# Altium schematic symbol library jlcpcb_2025_04_resistors_extended_2512.schlib: 2667 symbols (part 7 of 14) (continued)
## FRC2512F1500TS (continued)
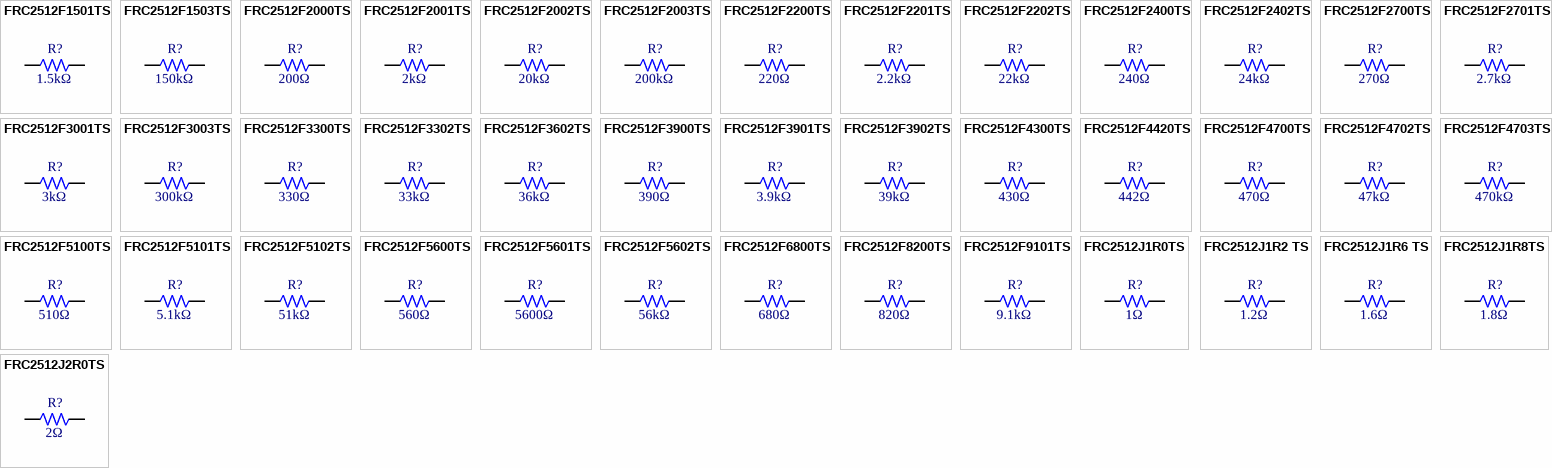
[diagram p32: symbols FRC2512F1501TS to FRC2512J2R0TS]

## FRC2512F1501TS
designator R?  Resistance: 1.5kΩ  (hidden comment: *)
Resistor, 1.5kΩ, ±1%, SMD 2512; Manufacturer: Uniroyal; Manufacturer Part Number: FRC2512F1501TS; Supplier 1: LCSC; Supplier Part Number 1: C5153994; JLCPCB Part Number: C5153994; Category: Resistors; Package Size: 2512; JLCPCB Basic Part: Yes; Tolerance: ±1%; ComponentLink1Description: Datasheet; ComponentLink1URL: https://wmsc.lcsc.com/wmsc/upload/file/pdf/v2/lcsc/2308241947_FOJAN-FRC2512F1501TS_C5153994.pdf; ComponentLink2Description: JLCPCB Part URL; ComponentLink2URL: https://jlcpcb.com/partdetail/C5153994
pins: 1, 2
1 alternate drawing of the same symbol

## FRC2512F1503TS
designator R?  Resistance: 150kΩ  (hidden comment: *)
Resistor, 150kΩ, ±1%, 1W, 200V, ±100ppm/℃, -55℃~+155℃, SMD 2512; Manufacturer: Uniroyal; Manufacturer Part Number: FRC2512F1503TS; Supplier 1: LCSC; Supplier Part Number 1: C2934050; JLCPCB Part Number: C2934050; Power Rating: 1W; Category: Resistors; Package Size: 2512; JLCPCB Basic Part: Yes; Tolerance: ±1%; Voltage Rating: 200V; Temperature Coefficient: ±100ppm/℃; Temperature Rating: -55℃~+155℃; ComponentLink1Description: Datasheet; ComponentLink1URL: https://wmsc.lcsc.com/wmsc/upload/file/pdf/v2/lcsc/2308241947_FOJAN-FRC2512F1503TS_C2934050.pdf; ComponentLink2Description: JLCPCB Part URL; ComponentLink2URL: https://jlcpcb.com/partdetail/C2934050
pins: 1, 2
1 alternate drawing of the same symbol

## FRC2512F2000TS
designator R?  Resistance: 200Ω  (hidden comment: *)
Resistor, 200Ω, ±1%, 1W, 200V, ±100ppm/℃, -55℃~+155℃, SMD 2512; Manufacturer: Uniroyal; Manufacturer Part Number: FRC2512F2000TS; Supplier 1: LCSC; Supplier Part Number 1: C2934056; JLCPCB Part Number: C2934056; Power Rating: 1W; Category: Resistors; Package Size: 2512; JLCPCB Basic Part: Yes; Tolerance: ±1%; Voltage Rating: 200V; Temperature Coefficient: ±100ppm/℃; Temperature Rating: -55℃~+155℃; ComponentLink1Description: Datasheet; ComponentLink1URL: https://wmsc.lcsc.com/wmsc/upload/file/pdf/v2/lcsc/2308241947_FOJAN-FRC2512F2000TS_C2934056.pdf; ComponentLink2Description: JLCPCB Part URL; ComponentLink2URL: https://jlcpcb.com/partdetail/C2934056
pins: 1, 2
1 alternate drawing of the same symbol

## FRC2512F2001TS
designator R?  Resistance: 2kΩ  (hidden comment: *)
Resistor, 2kΩ, ±1%, 1W, 200V, ±100ppm/℃, -55℃~+155℃, SMD 2512; Manufacturer: Uniroyal; Manufacturer Part Number: FRC2512F2001TS; Supplier 1: LCSC; Supplier Part Number 1: C2934057; JLCPCB Part Number: C2934057; Power Rating: 1W; Category: Resistors; Package Size: 2512; JLCPCB Basic Part: Yes; Tolerance: ±1%; Voltage Rating: 200V; Temperature Coefficient: ±100ppm/℃; Temperature Rating: -55℃~+155℃; ComponentLink1Description: Datasheet; ComponentLink1URL: https://wmsc.lcsc.com/wmsc/upload/file/pdf/v2/lcsc/2308241947_FOJAN-FRC2512F2001TS_C2934057.pdf; ComponentLink2Description: JLCPCB Part URL; ComponentLink2URL: https://jlcpcb.com/partdetail/C2934057
pins: 1, 2
1 alternate drawing of the same symbol

## FRC2512F2002TS
designator R?  Resistance: 20kΩ  (hidden comment: *)
Resistor, 20kΩ, ±1%, 1W, 200V, ±100ppm/℃, -55℃~+155℃, SMD 2512; Manufacturer: Uniroyal; Manufacturer Part Number: FRC2512F2002TS; Supplier 1: LCSC; Supplier Part Number 1: C2934058; JLCPCB Part Number: C2934058; Power Rating: 1W; Category: Resistors; Package Size: 2512; JLCPCB Basic Part: Yes; Tolerance: ±1%; Voltage Rating: 200V; Temperature Coefficient: ±100ppm/℃; Temperature Rating: -55℃~+155℃; ComponentLink1Description: Datasheet; ComponentLink1URL: https://wmsc.lcsc.com/wmsc/upload/file/pdf/v2/lcsc/2308241947_FOJAN-FRC2512F2002TS_C2934058.pdf; ComponentLink2Description: JLCPCB Part URL; ComponentLink2URL: https://jlcpcb.com/partdetail/C2934058
pins: 1, 2
1 alternate drawing of the same symbol

## FRC2512F2003TS
designator R?  Resistance: 200kΩ  (hidden comment: *)
Resistor, 200kΩ, ±1%, 1W, 200V, ±100ppm/℃, -55℃~+155℃, SMD 2512; Manufacturer: Uniroyal; Manufacturer Part Number: FRC2512F2003TS; Supplier 1: LCSC; Supplier Part Number 1: C2934059; JLCPCB Part Number: C2934059; Power Rating: 1W; Category: Resistors; Package Size: 2512; JLCPCB Basic Part: Yes; Tolerance: ±1%; Voltage Rating: 200V; Temperature Coefficient: ±100ppm/℃; Temperature Rating: -55℃~+155℃; ComponentLink1Description: Datasheet; ComponentLink1URL: https://wmsc.lcsc.com/wmsc/upload/file/pdf/v2/lcsc/2308241947_FOJAN-FRC2512F2003TS_C2934059.pdf; ComponentLink2Description: JLCPCB Part URL; ComponentLink2URL: https://jlcpcb.com/partdetail/C2934059
pins: 1, 2
1 alternate drawing of the same symbol

## FRC2512F2200TS
designator R?  Resistance: 220Ω  (hidden comment: *)
Resistor, 220Ω, ±1%, 1W, 200V, ±100ppm/℃, -55℃~+155℃, SMD 2512; Manufacturer: Uniroyal; Manufacturer Part Number: FRC2512F2200TS; Supplier 1: LCSC; Supplier Part Number 1: C2934060; JLCPCB Part Number: C2934060; Power Rating: 1W; Category: Resistors; Package Size: 2512; JLCPCB Basic Part: Yes; Tolerance: ±1%; Voltage Rating: 200V; Temperature Coefficient: ±100ppm/℃; Temperature Rating: -55℃~+155℃; ComponentLink1Description: Datasheet; ComponentLink1URL: https://wmsc.lcsc.com/wmsc/upload/file/pdf/v2/lcsc/2308241947_FOJAN-FRC2512F2200TS_C2934060.pdf; ComponentLink2Description: JLCPCB Part URL; ComponentLink2URL: https://jlcpcb.com/partdetail/C2934060
pins: 1, 2
1 alternate drawing of the same symbol

## FRC2512F2201TS
designator R?  Resistance: 2.2kΩ  (hidden comment: *)
Resistor, 2.2kΩ, ±1%, 1W, 200V, ±100ppm/℃, SMD 2512; Manufacturer: Uniroyal; Manufacturer Part Number: FRC2512F2201TS; Supplier 1: LCSC; Supplier Part Number 1: C2999626; JLCPCB Part Number: C2999626; Power Rating: 1W; Category: Resistors; Package Size: 2512; JLCPCB Basic Part: Yes; Tolerance: ±1%; Voltage Rating: 200V; Temperature Coefficient: ±100ppm/℃; ComponentLink1Description: Datasheet; ComponentLink1URL: https://wmsc.lcsc.com/wmsc/upload/file/pdf/v2/lcsc/2308241947_FOJAN-FRC2512F2201TS_C2999626.pdf; ComponentLink2Description: JLCPCB Part URL; ComponentLink2URL: https://jlcpcb.com/partdetail/C2999626
pins: 1, 2
1 alternate drawing of the same symbol

## FRC2512F2202TS
designator R?  Resistance: 22kΩ  (hidden comment: *)
Resistor, 22kΩ, ±1%, 1W, 200V, ±100ppm/℃, SMD 2512; Manufacturer: Uniroyal; Manufacturer Part Number: FRC2512F2202TS; Supplier 1: LCSC; Supplier Part Number 1: C2999601; JLCPCB Part Number: C2999601; Power Rating: 1W; Category: Resistors; Package Size: 2512; JLCPCB Basic Part: Yes; Tolerance: ±1%; Voltage Rating: 200V; Temperature Coefficient: ±100ppm/℃; ComponentLink1Description: Datasheet; ComponentLink1URL: https://wmsc.lcsc.com/wmsc/upload/file/pdf/v2/lcsc/2308241947_FOJAN-FRC2512F2202TS_C2999601.pdf; ComponentLink2Description: JLCPCB Part URL; ComponentLink2URL: https://jlcpcb.com/partdetail/C2999601
pins: 1, 2
1 alternate drawing of the same symbol

## FRC2512F2400TS
designator R?  Resistance: 240Ω  (hidden comment: *)
Resistor, 240Ω, ±1%, 1W, 200V, ±100ppm/℃, SMD 2512; Manufacturer: Uniroyal; Manufacturer Part Number: FRC2512F2400TS; Supplier 1: LCSC; Supplier Part Number 1: C3013320; JLCPCB Part Number: C3013320; Power Rating: 1W; Category: Resistors; Package Size: 2512; JLCPCB Basic Part: Yes; Tolerance: ±1%; Voltage Rating: 200V; Temperature Coefficient: ±100ppm/℃; ComponentLink1Description: Datasheet; ComponentLink1URL: https://wmsc.lcsc.com/wmsc/upload/file/pdf/v2/lcsc/2308241947_FOJAN-FRC2512F2400TS_C3013320.pdf; ComponentLink2Description: JLCPCB Part URL; ComponentLink2URL: https://jlcpcb.com/partdetail/C3013320
pins: 1, 2
1 alternate drawing of the same symbol

## FRC2512F2402TS
designator R?  Resistance: 24kΩ  (hidden comment: *)
Resistor, 24kΩ, ±1%, 1W, 200V, ±100ppm/℃, -55℃~+155℃, SMD 2512; Manufacturer: Uniroyal; Manufacturer Part Number: FRC2512F2402TS; Supplier 1: LCSC; Supplier Part Number 1: C2960876; JLCPCB Part Number: C2960876; Power Rating: 1W; Category: Resistors; Package Size: 2512; JLCPCB Basic Part: Yes; Tolerance: ±1%; Voltage Rating: 200V; Temperature Coefficient: ±100ppm/℃; Temperature Rating: -55℃~+155℃; ComponentLink1Description: Datasheet; ComponentLink1URL: https://wmsc.lcsc.com/wmsc/upload/file/pdf/v2/lcsc/2308241947_FOJAN-FRC2512F2402TS_C2960876.pdf; ComponentLink2Description: JLCPCB Part URL; ComponentLink2URL: https://jlcpcb.com/partdetail/C2960876
pins: 1, 2
1 alternate drawing of the same symbol

## FRC2512F2700TS
designator R?  Resistance: 270Ω  (hidden comment: *)
Resistor, 270Ω, ±1%, 1W, 200V, ±100ppm/℃, -55℃~+155℃, SMD 2512; Manufacturer: Uniroyal; Manufacturer Part Number: FRC2512F2700TS; Supplier 1: LCSC; Supplier Part Number 1: C2974110; JLCPCB Part Number: C2974110; Power Rating: 1W; Category: Resistors; Package Size: 2512; JLCPCB Basic Part: Yes; Tolerance: ±1%; Voltage Rating: 200V; Temperature Coefficient: ±100ppm/℃; Temperature Rating: -55℃~+155℃; ComponentLink1Description: Datasheet; ComponentLink1URL: https://wmsc.lcsc.com/wmsc/upload/file/pdf/v2/lcsc/2202151130_FOJAN-FRC2512F2700TS_C2974110.pdf; ComponentLink2Description: JLCPCB Part URL; ComponentLink2URL: https://jlcpcb.com/partdetail/C2974110
pins: 1, 2
1 alternate drawing of the same symbol

## FRC2512F2701TS
designator R?  Resistance: 2.7kΩ  (hidden comment: *)
Resistor, 2.7kΩ, ±1%, 1W, 200V, ±100ppm/℃, -55℃~+155℃, SMD 2512; Manufacturer: Uniroyal; Manufacturer Part Number: FRC2512F2701TS; Supplier 1: LCSC; Supplier Part Number 1: C2934063; JLCPCB Part Number: C2934063; Power Rating: 1W; Category: Resistors; Package Size: 2512; JLCPCB Basic Part: Yes; Tolerance: ±1%; Voltage Rating: 200V; Temperature Coefficient: ±100ppm/℃; Temperature Rating: -55℃~+155℃; ComponentLink1Description: Datasheet; ComponentLink1URL: https://wmsc.lcsc.com/wmsc/upload/file/pdf/v2/lcsc/2308241947_FOJAN-FRC2512F2701TS_C2934063.pdf; ComponentLink2Description: JLCPCB Part URL; ComponentLink2URL: https://jlcpcb.com/partdetail/C2934063
pins: 1, 2
1 alternate drawing of the same symbol

## FRC2512F3001TS
designator R?  Resistance: 3kΩ  (hidden comment: *)
Resistor, 3kΩ, ±1%, 1W, 200V, ±100ppm/℃, SMD 2512; Manufacturer: Uniroyal; Manufacturer Part Number: FRC2512F3001TS; Supplier 1: LCSC; Supplier Part Number 1: C3000675; JLCPCB Part Number: C3000675; Power Rating: 1W; Category: Resistors; Package Size: 2512; JLCPCB Basic Part: Yes; Tolerance: ±1%; Voltage Rating: 200V; Temperature Coefficient: ±100ppm/℃; ComponentLink1Description: Datasheet; ComponentLink1URL: https://wmsc.lcsc.com/wmsc/upload/file/pdf/v2/lcsc/2308241947_FOJAN-FRC2512F3001TS_C3000675.pdf; ComponentLink2Description: JLCPCB Part URL; ComponentLink2URL: https://jlcpcb.com/partdetail/C3000675
pins: 1, 2
1 alternate drawing of the same symbol

## FRC2512F3003TS
designator R?  Resistance: 300kΩ  (hidden comment: *)
Resistor, 300kΩ, ±1%, 1W, 200V, ±100ppm/℃, -55℃~+155℃, SMD 2512; Manufacturer: Uniroyal; Manufacturer Part Number: FRC2512F3003TS; Supplier 1: LCSC; Supplier Part Number 1: C2960835; JLCPCB Part Number: C2960835; Power Rating: 1W; Category: Resistors; Package Size: 2512; JLCPCB Basic Part: Yes; Tolerance: ±1%; Voltage Rating: 200V; Temperature Coefficient: ±100ppm/℃; Temperature Rating: -55℃~+155℃; ComponentLink1Description: Datasheet; ComponentLink1URL: https://wmsc.lcsc.com/wmsc/upload/file/pdf/v2/lcsc/2308241947_FOJAN-FRC2512F3003TS_C2960835.pdf; ComponentLink2Description: JLCPCB Part URL; ComponentLink2URL: https://jlcpcb.com/partdetail/C2960835
pins: 1, 2
1 alternate drawing of the same symbol

## FRC2512F3300TS
designator R?  Resistance: 330Ω  (hidden comment: *)
Resistor, 330Ω, ±1%, 1W, 200V, ±100ppm/℃, -55℃~+155℃, SMD 2512; Manufacturer: Uniroyal; Manufacturer Part Number: FRC2512F3300TS; Supplier 1: LCSC; Supplier Part Number 1: C2934068; JLCPCB Part Number: C2934068; Power Rating: 1W; Category: Resistors; Package Size: 2512; JLCPCB Basic Part: Yes; Tolerance: ±1%; Voltage Rating: 200V; Temperature Coefficient: ±100ppm/℃; Temperature Rating: -55℃~+155℃; ComponentLink1Description: Datasheet; ComponentLink1URL: https://wmsc.lcsc.com/wmsc/upload/file/pdf/v2/lcsc/2308241947_FOJAN-FRC2512F3300TS_C2934068.pdf; ComponentLink2Description: JLCPCB Part URL; ComponentLink2URL: https://jlcpcb.com/partdetail/C2934068
pins: 1, 2
1 alternate drawing of the same symbol

## FRC2512F3302TS
designator R?  Resistance: 33kΩ  (hidden comment: *)
Resistor, 33kΩ, ±1%, 1W, 200V, ±100ppm/℃, -55℃~+155℃, SMD 2512; Manufacturer: Uniroyal; Manufacturer Part Number: FRC2512F3302TS; Supplier 1: LCSC; Supplier Part Number 1: C2934069; JLCPCB Part Number: C2934069; Power Rating: 1W; Category: Resistors; Package Size: 2512; JLCPCB Basic Part: Yes; Tolerance: ±1%; Voltage Rating: 200V; Temperature Coefficient: ±100ppm/℃; Temperature Rating: -55℃~+155℃; ComponentLink1Description: Datasheet; ComponentLink1URL: https://wmsc.lcsc.com/wmsc/upload/file/pdf/v2/lcsc/2308241947_FOJAN-FRC2512F3302TS_C2934069.pdf; ComponentLink2Description: JLCPCB Part URL; ComponentLink2URL: https://jlcpcb.com/partdetail/C2934069
pins: 1, 2
1 alternate drawing of the same symbol

## FRC2512F3602TS
designator R?  Resistance: 36kΩ  (hidden comment: *)
Resistor, 36kΩ, ±1%, 1W, 200V, ±100ppm/℃, -55℃~+155℃, SMD 2512; Manufacturer: Uniroyal; Manufacturer Part Number: FRC2512F3602TS; Supplier 1: LCSC; Supplier Part Number 1: C2934071; JLCPCB Part Number: C2934071; Power Rating: 1W; Category: Resistors; Package Size: 2512; JLCPCB Basic Part: Yes; Tolerance: ±1%; Voltage Rating: 200V; Temperature Coefficient: ±100ppm/℃; Temperature Rating: -55℃~+155℃; ComponentLink1Description: Datasheet; ComponentLink1URL: https://wmsc.lcsc.com/wmsc/upload/file/pdf/v2/lcsc/2308241947_FOJAN-FRC2512F3602TS_C2934071.pdf; ComponentLink2Description: JLCPCB Part URL; ComponentLink2URL: https://jlcpcb.com/partdetail/C2934071
pins: 1, 2
1 alternate drawing of the same symbol

## FRC2512F3900TS
designator R?  Resistance: 390Ω  (hidden comment: *)
Resistor, 390Ω, ±1%, 1W, 200V, ±100ppm/℃, SMD 2512; Manufacturer: Uniroyal; Manufacturer Part Number: FRC2512F3900TS; Supplier 1: LCSC; Supplier Part Number 1: C3013323; JLCPCB Part Number: C3013323; Power Rating: 1W; Category: Resistors; Package Size: 2512; JLCPCB Basic Part: Yes; Tolerance: ±1%; Voltage Rating: 200V; Temperature Coefficient: ±100ppm/℃; ComponentLink1Description: Datasheet; ComponentLink1URL: https://wmsc.lcsc.com/wmsc/upload/file/pdf/v2/lcsc/2308241947_FOJAN-FRC2512F3900TS_C3013323.pdf; ComponentLink2Description: JLCPCB Part URL; ComponentLink2URL: https://jlcpcb.com/partdetail/C3013323
pins: 1, 2
1 alternate drawing of the same symbol

## FRC2512F3901TS
designator R?  Resistance: 3.9kΩ  (hidden comment: *)
Resistor, 3.9kΩ, ±1%, 1W, 200V, ±100ppm/℃, -55℃~+155℃, SMD 2512; Manufacturer: Uniroyal; Manufacturer Part Number: FRC2512F3901TS; Supplier 1: LCSC; Supplier Part Number 1: C2934072; JLCPCB Part Number: C2934072; Power Rating: 1W; Category: Resistors; Package Size: 2512; JLCPCB Basic Part: Yes; Tolerance: ±1%; Voltage Rating: 200V; Temperature Coefficient: ±100ppm/℃; Temperature Rating: -55℃~+155℃; ComponentLink1Description: Datasheet; ComponentLink1URL: https://wmsc.lcsc.com/wmsc/upload/file/pdf/v2/lcsc/2308241947_FOJAN-FRC2512F3901TS_C2934072.pdf; ComponentLink2Description: JLCPCB Part URL; ComponentLink2URL: https://jlcpcb.com/partdetail/C2934072
pins: 1, 2
1 alternate drawing of the same symbol

## FRC2512F3902TS
designator R?  Resistance: 39kΩ  (hidden comment: *)
Resistor, 39kΩ, ±1%, 1W, 200V, ±100ppm/℃, SMD 2512; Manufacturer: Uniroyal; Manufacturer Part Number: FRC2512F3902TS; Supplier 1: LCSC; Supplier Part Number 1: C5713379; JLCPCB Part Number: C5713379; Power Rating: 1W; Category: Resistors; Package Size: 2512; JLCPCB Basic Part: Yes; Tolerance: ±1%; Voltage Rating: 200V; Temperature Coefficient: ±100ppm/℃; ComponentLink1Description: Datasheet; ComponentLink1URL: https://wmsc.lcsc.com/wmsc/upload/file/pdf/v2/lcsc/2308241947_FOJAN-FRC2512F3902TS_C5713379.pdf; ComponentLink2Description: JLCPCB Part URL; ComponentLink2URL: https://jlcpcb.com/partdetail/C5713379
pins: 1, 2
1 alternate drawing of the same symbol

## FRC2512F4300TS
designator R?  Resistance: 430Ω  (hidden comment: *)
Resistor, 430Ω, ±1%, 1W, 200V, ±100ppm/℃, -55℃~+155℃, SMD 2512; Manufacturer: Uniroyal; Manufacturer Part Number: FRC2512F4300TS; Supplier 1: LCSC; Supplier Part Number 1: C2934074; JLCPCB Part Number: C2934074; Power Rating: 1W; Category: Resistors; Package Size: 2512; JLCPCB Basic Part: Yes; Tolerance: ±1%; Voltage Rating: 200V; Temperature Coefficient: ±100ppm/℃; Temperature Rating: -55℃~+155℃; ComponentLink1Description: Datasheet; ComponentLink1URL: https://wmsc.lcsc.com/wmsc/upload/file/pdf/v2/lcsc/2308241947_FOJAN-FRC2512F4300TS_C2934074.pdf; ComponentLink2Description: JLCPCB Part URL; ComponentLink2URL: https://jlcpcb.com/partdetail/C2934074
pins: 1, 2
1 alternate drawing of the same symbol

## FRC2512F4420TS
designator R?  Resistance: 442Ω  (hidden comment: *)
Resistor, 442Ω, ±1%, 1W, 200V, ±100ppm/℃, SMD 2512; Manufacturer: Uniroyal; Manufacturer Part Number: FRC2512F4420TS; Supplier 1: LCSC; Supplier Part Number 1: C3013324; JLCPCB Part Number: C3013324; Power Rating: 1W; Category: Resistors; Package Size: 2512; JLCPCB Basic Part: Yes; Tolerance: ±1%; Voltage Rating: 200V; Temperature Coefficient: ±100ppm/℃; ComponentLink1Description: Datasheet; ComponentLink1URL: https://wmsc.lcsc.com/wmsc/upload/file/pdf/v2/lcsc/2308241947_FOJAN-FRC2512F4420TS_C3013324.pdf; ComponentLink2Description: JLCPCB Part URL; ComponentLink2URL: https://jlcpcb.com/partdetail/C3013324
pins: 1, 2
1 alternate drawing of the same symbol

## FRC2512F4700TS
designator R?  Resistance: 470Ω  (hidden comment: *)
Resistor, 470Ω, ±1%, 1W, 200V, ±100ppm/℃, -55℃~+155℃, SMD 2512; Manufacturer: Uniroyal; Manufacturer Part Number: FRC2512F4700TS; Supplier 1: LCSC; Supplier Part Number 1: C2934075; JLCPCB Part Number: C2934075; Power Rating: 1W; Category: Resistors; Package Size: 2512; JLCPCB Basic Part: Yes; Tolerance: ±1%; Voltage Rating: 200V; Temperature Coefficient: ±100ppm/℃; Temperature Rating: -55℃~+155℃; ComponentLink1Description: Datasheet; ComponentLink1URL: https://wmsc.lcsc.com/wmsc/upload/file/pdf/v2/lcsc/2308241947_FOJAN-FRC2512F4700TS_C2934075.pdf; ComponentLink2Description: JLCPCB Part URL; ComponentLink2URL: https://jlcpcb.com/partdetail/C2934075
pins: 1, 2
1 alternate drawing of the same symbol

## FRC2512F4702TS
designator R?  Resistance: 47kΩ  (hidden comment: *)
Resistor, 47kΩ, ±1%, 1W, 200V, ±100ppm/℃, -55℃~+155℃, SMD 2512; Manufacturer: Uniroyal; Manufacturer Part Number: FRC2512F4702TS; Supplier 1: LCSC; Supplier Part Number 1: C2934076; JLCPCB Part Number: C2934076; Power Rating: 1W; Category: Resistors; Package Size: 2512; JLCPCB Basic Part: Yes; Tolerance: ±1%; Voltage Rating: 200V; Temperature Coefficient: ±100ppm/℃; Temperature Rating: -55℃~+155℃; ComponentLink1Description: Datasheet; ComponentLink1URL: https://wmsc.lcsc.com/wmsc/upload/file/pdf/v2/lcsc/2308241947_FOJAN-FRC2512F4702TS_C2934076.pdf; ComponentLink2Description: JLCPCB Part URL; ComponentLink2URL: https://jlcpcb.com/partdetail/C2934076
pins: 1, 2
1 alternate drawing of the same symbol

## FRC2512F4703TS
designator R?  Resistance: 470kΩ  (hidden comment: *)
Resistor, 470kΩ, ±1%, 1W, 200V, ±100ppm/℃, -55℃~+155℃, SMD 2512; Manufacturer: Uniroyal; Manufacturer Part Number: FRC2512F4703TS; Supplier 1: LCSC; Supplier Part Number 1: C2934077; JLCPCB Part Number: C2934077; Power Rating: 1W; Category: Resistors; Package Size: 2512; JLCPCB Basic Part: Yes; Tolerance: ±1%; Voltage Rating: 200V; Temperature Coefficient: ±100ppm/℃; Temperature Rating: -55℃~+155℃; ComponentLink1Description: Datasheet; ComponentLink1URL: https://wmsc.lcsc.com/wmsc/upload/file/pdf/v2/lcsc/2308241947_FOJAN-FRC2512F4703TS_C2934077.pdf; ComponentLink2Description: JLCPCB Part URL; ComponentLink2URL: https://jlcpcb.com/partdetail/C2934077
pins: 1, 2
1 alternate drawing of the same symbol

## FRC2512F5100TS
designator R?  Resistance: 510Ω  (hidden comment: *)
Resistor, 510Ω, ±1%, 1W, 200V, SMD 2512; Manufacturer: Uniroyal; Manufacturer Part Number: FRC2512F5100TS; Supplier 1: LCSC; Supplier Part Number 1: C3000559; JLCPCB Part Number: C3000559; Power Rating: 1W; Category: Resistors; Package Size: 2512; JLCPCB Basic Part: Yes; Tolerance: ±1%; Voltage Rating: 200V; ComponentLink1Description: Datasheet; ComponentLink1URL: https://wmsc.lcsc.com/wmsc/upload/file/pdf/v2/lcsc/2308241947_FOJAN-FRC2512F5100TS_C3000559.pdf; ComponentLink2Description: JLCPCB Part URL; ComponentLink2URL: https://jlcpcb.com/partdetail/C3000559
pins: 1, 2
1 alternate drawing of the same symbol

## FRC2512F5101TS
designator R?  Resistance: 5.1kΩ  (hidden comment: *)
Resistor, 5.1kΩ, ±1%, 1W, 200V, ±100ppm/℃, -55℃~+155℃, SMD 2512; Manufacturer: Uniroyal; Manufacturer Part Number: FRC2512F5101TS; Supplier 1: LCSC; Supplier Part Number 1: C2960812; JLCPCB Part Number: C2960812; Power Rating: 1W; Category: Resistors; Package Size: 2512; JLCPCB Basic Part: Yes; Tolerance: ±1%; Voltage Rating: 200V; Temperature Coefficient: ±100ppm/℃; Temperature Rating: -55℃~+155℃; ComponentLink1Description: Datasheet; ComponentLink1URL: https://wmsc.lcsc.com/wmsc/upload/file/pdf/v2/lcsc/2308241947_FOJAN-FRC2512F5101TS_C2960812.pdf; ComponentLink2Description: JLCPCB Part URL; ComponentLink2URL: https://jlcpcb.com/partdetail/C2960812
pins: 1, 2
1 alternate drawing of the same symbol

## FRC2512F5102TS
designator R?  Resistance: 51kΩ  (hidden comment: *)
Resistor, 51kΩ, ±1%, 1W, 200V, ±100ppm/℃, -55℃~+155℃, SMD 2512; Manufacturer: Uniroyal; Manufacturer Part Number: FRC2512F5102TS; Supplier 1: LCSC; Supplier Part Number 1: C2960777; JLCPCB Part Number: C2960777; Power Rating: 1W; Category: Resistors; Package Size: 2512; JLCPCB Basic Part: Yes; Tolerance: ±1%; Voltage Rating: 200V; Temperature Coefficient: ±100ppm/℃; Temperature Rating: -55℃~+155℃; ComponentLink1Description: Datasheet; ComponentLink1URL: https://wmsc.lcsc.com/wmsc/upload/file/pdf/v2/lcsc/2308241947_FOJAN-FRC2512F5102TS_C2960777.pdf; ComponentLink2Description: JLCPCB Part URL; ComponentLink2URL: https://jlcpcb.com/partdetail/C2960777
pins: 1, 2
1 alternate drawing of the same symbol

## FRC2512F5600TS
designator R?  Resistance: 560Ω  (hidden comment: *)
Resistor, 560Ω, ±1%, 1W, 200V, ±100ppm/℃, SMD 2512; Manufacturer: Uniroyal; Manufacturer Part Number: FRC2512F5600TS; Supplier 1: LCSC; Supplier Part Number 1: C2999537; JLCPCB Part Number: C2999537; Power Rating: 1W; Category: Resistors; Package Size: 2512; JLCPCB Basic Part: Yes; Tolerance: ±1%; Voltage Rating: 200V; Temperature Coefficient: ±100ppm/℃; ComponentLink1Description: Datasheet; ComponentLink1URL: https://wmsc.lcsc.com/wmsc/upload/file/pdf/v2/lcsc/2308241947_FOJAN-FRC2512F5600TS_C2999537.pdf; ComponentLink2Description: JLCPCB Part URL; ComponentLink2URL: https://jlcpcb.com/partdetail/C2999537
pins: 1, 2
1 alternate drawing of the same symbol

## FRC2512F5601TS
designator R?  Resistance: 5600Ω  (hidden comment: *)
Resistor, 5600Ω, ±1%, 1W, 200V, ±100ppm/℃, SMD 2512; Manufacturer: Uniroyal; Manufacturer Part Number: FRC2512F5601TS; Supplier 1: LCSC; Supplier Part Number 1: C5154003; JLCPCB Part Number: C5154003; Power Rating: 1W; Category: Resistors; Package Size: 2512; JLCPCB Basic Part: Yes; Tolerance: ±1%; Voltage Rating: 200V; Temperature Coefficient: ±100ppm/℃; ComponentLink1Description: Datasheet; ComponentLink1URL: https://wmsc.lcsc.com/wmsc/upload/file/pdf/v2/lcsc/2308241947_FOJAN-FRC2512F5601TS_C5154003.pdf; ComponentLink2Description: JLCPCB Part URL; ComponentLink2URL: https://jlcpcb.com/partdetail/C5154003
pins: 1, 2
1 alternate drawing of the same symbol

## FRC2512F5602TS
designator R?  Resistance: 56kΩ  (hidden comment: *)
Resistor, 56kΩ, ±1%, 1W, 200V, ±100ppm/℃, SMD 2512; Manufacturer: Uniroyal; Manufacturer Part Number: FRC2512F5602TS; Supplier 1: LCSC; Supplier Part Number 1: C3000560; JLCPCB Part Number: C3000560; Power Rating: 1W; Category: Resistors; Package Size: 2512; JLCPCB Basic Part: Yes; Tolerance: ±1%; Voltage Rating: 200V; Temperature Coefficient: ±100ppm/℃; ComponentLink1Description: Datasheet; ComponentLink1URL: https://wmsc.lcsc.com/wmsc/upload/file/pdf/v2/lcsc/2308241947_FOJAN-FRC2512F5602TS_C3000560.pdf; ComponentLink2Description: JLCPCB Part URL; ComponentLink2URL: https://jlcpcb.com/partdetail/C3000560
pins: 1, 2
1 alternate drawing of the same symbol

## FRC2512F6800TS
designator R?  Resistance: 680Ω  (hidden comment: *)
Resistor, 680Ω, ±1%, 1W, 200V, ±100ppm/℃, SMD 2512; Manufacturer: Uniroyal; Manufacturer Part Number: FRC2512F6800TS; Supplier 1: LCSC; Supplier Part Number 1: C2999607; JLCPCB Part Number: C2999607; Power Rating: 1W; Category: Resistors; Package Size: 2512; JLCPCB Basic Part: Yes; Tolerance: ±1%; Voltage Rating: 200V; Temperature Coefficient: ±100ppm/℃; ComponentLink1Description: Datasheet; ComponentLink1URL: https://wmsc.lcsc.com/wmsc/upload/file/pdf/v2/lcsc/2308241947_FOJAN-FRC2512F6800TS_C2999607.pdf; ComponentLink2Description: JLCPCB Part URL; ComponentLink2URL: https://jlcpcb.com/partdetail/C2999607
pins: 1, 2
1 alternate drawing of the same symbol

## FRC2512F8200TS
designator R?  Resistance: 820Ω  (hidden comment: *)
Resistor, 820Ω, ±1%, 1W, 200V, ±100ppm/℃, SMD 2512; Manufacturer: Uniroyal; Manufacturer Part Number: FRC2512F8200TS; Supplier 1: LCSC; Supplier Part Number 1: C2999541; JLCPCB Part Number: C2999541; Power Rating: 1W; Category: Resistors; Package Size: 2512; JLCPCB Basic Part: Yes; Tolerance: ±1%; Voltage Rating: 200V; Temperature Coefficient: ±100ppm/℃; ComponentLink1Description: Datasheet; ComponentLink1URL: https://wmsc.lcsc.com/wmsc/upload/file/pdf/v2/lcsc/2308241947_FOJAN-FRC2512F8200TS_C2999541.pdf; ComponentLink2Description: JLCPCB Part URL; ComponentLink2URL: https://jlcpcb.com/partdetail/C2999541
pins: 1, 2
1 alternate drawing of the same symbol

## FRC2512F9101TS
designator R?  Resistance: 9.1kΩ  (hidden comment: *)
Resistor, 9.1kΩ, ±1%, 1W, 200V, ±100ppm/℃, -55℃~+155℃, SMD 2512; Manufacturer: Uniroyal; Manufacturer Part Number: FRC2512F9101TS; Supplier 1: LCSC; Supplier Part Number 1: C2960819; JLCPCB Part Number: C2960819; Power Rating: 1W; Category: Resistors; Package Size: 2512; JLCPCB Basic Part: Yes; Tolerance: ±1%; Voltage Rating: 200V; Temperature Coefficient: ±100ppm/℃; Temperature Rating: -55℃~+155℃; ComponentLink1Description: Datasheet; ComponentLink1URL: https://wmsc.lcsc.com/wmsc/upload/file/pdf/v2/lcsc/2308241947_FOJAN-FRC2512F9101TS_C2960819.pdf; ComponentLink2Description: JLCPCB Part URL; ComponentLink2URL: https://jlcpcb.com/partdetail/C2960819
pins: 1, 2
1 alternate drawing of the same symbol

## FRC2512J1R0TS
designator R?  Resistance: 1Ω  (hidden comment: *)
Resistor, 1Ω, ±5%, 1W, 200V, ±200ppm/℃, SMD 2512; Manufacturer: Uniroyal; Manufacturer Part Number: FRC2512J1R0TS; Supplier 1: LCSC; Supplier Part Number 1: C3000711; JLCPCB Part Number: C3000711; Power Rating: 1W; Category: Resistors; Package Size: 2512; JLCPCB Basic Part: Yes; Tolerance: ±5%; Voltage Rating: 200V; Temperature Coefficient: ±200ppm/℃; ComponentLink1Description: Datasheet; ComponentLink1URL: https://wmsc.lcsc.com/wmsc/upload/file/pdf/v2/lcsc/2308241947_FOJAN-FRC2512J1R0TS_C3000711.pdf; ComponentLink2Description: JLCPCB Part URL; ComponentLink2URL: https://jlcpcb.com/partdetail/C3000711
pins: 1, 2
1 alternate drawing of the same symbol

## FRC2512J1R2 TS
designator R?  Resistance: 1.2Ω  (hidden comment: *)
Resistor, 1.2Ω, ±5%, 1W, 200V, ±200ppm/℃, SMD 2512; Manufacturer: Uniroyal; Manufacturer Part Number: FRC2512J1R2 TS; Supplier 1: LCSC; Supplier Part Number 1: C3013329; JLCPCB Part Number: C3013329; Power Rating: 1W; Category: Resistors; Package Size: 2512; JLCPCB Basic Part: Yes; Tolerance: ±5%; Voltage Rating: 200V; Temperature Coefficient: ±200ppm/℃; ComponentLink1Description: Datasheet; ComponentLink1URL: https://wmsc.lcsc.com/wmsc/upload/file/pdf/v2/lcsc/2308241947_FOJAN-FRC2512J1R2-TS_C3013329.pdf; ComponentLink2Description: JLCPCB Part URL; ComponentLink2URL: https://jlcpcb.com/partdetail/C3013329
pins: 1, 2
1 alternate drawing of the same symbol

## FRC2512J1R6 TS
designator R?  Resistance: 1.6Ω  (hidden comment: *)
Resistor, 1.6Ω, ±5%, 1W, 200V, ±200ppm/℃, -55℃~+155℃, SMD 2512; Manufacturer: Uniroyal; Manufacturer Part Number: FRC2512J1R6 TS; Supplier 1: LCSC; Supplier Part Number 1: C2960933; JLCPCB Part Number: C2960933; Power Rating: 1W; Category: Resistors; Package Size: 2512; JLCPCB Basic Part: Yes; Tolerance: ±5%; Voltage Rating: 200V; Temperature Coefficient: ±200ppm/℃; Temperature Rating: -55℃~+155℃; ComponentLink1Description: Datasheet; ComponentLink1URL: https://wmsc.lcsc.com/wmsc/upload/file/pdf/v2/lcsc/2308241947_FOJAN-FRC2512J1R6-TS_C2960933.pdf; ComponentLink2Description: JLCPCB Part URL; ComponentLink2URL: https://jlcpcb.com/partdetail/C2960933
pins: 1, 2
1 alternate drawing of the same symbol

## FRC2512J1R8TS
designator R?  Resistance: 1.8Ω  (hidden comment: *)
Resistor, 1.8Ω, ±5%, 1W, 200V, ±200ppm/℃, -55℃~+155℃, SMD 2512; Manufacturer: Uniroyal; Manufacturer Part Number: FRC2512J1R8TS; Supplier 1: LCSC; Supplier Part Number 1: C2930458; JLCPCB Part Number: C2930458; Power Rating: 1W; Category: Resistors; Package Size: 2512; JLCPCB Basic Part: Yes; Tolerance: ±5%; Voltage Rating: 200V; Temperature Coefficient: ±200ppm/℃; Temperature Rating: -55℃~+155℃; ComponentLink1Description: Datasheet; ComponentLink1URL: https://wmsc.lcsc.com/wmsc/upload/file/pdf/v2/lcsc/2308241947_FOJAN-FRC2512J1R8TS_C2930458.pdf; ComponentLink2Description: JLCPCB Part URL; ComponentLink2URL: https://jlcpcb.com/partdetail/C2930458
pins: 1, 2
1 alternate drawing of the same symbol

## FRC2512J2R0TS
designator R?  Resistance: 2Ω  (hidden comment: *)
Resistor, 2Ω, ±5%, 1W, 200V, ±200ppm/℃, SMD 2512; Manufacturer: Uniroyal; Manufacturer Part Number: FRC2512J2R0TS; Supplier 1: LCSC; Supplier Part Number 1: C3000637; JLCPCB Part Number: C3000637; Power Rating: 1W; Category: Resistors; Package Size: 2512; JLCPCB Basic Part: Yes; Tolerance: ±5%; Voltage Rating: 200V; Temperature Coefficient: ±200ppm/℃; ComponentLink1Description: Datasheet; ComponentLink1URL: https://wmsc.lcsc.com/wmsc/upload/file/pdf/v2/lcsc/2308241947_FOJAN-FRC2512J2R0TS_C3000637.pdf; ComponentLink2Description: JLCPCB Part URL; ComponentLink2URL: https://jlcpcb.com/partdetail/C3000637
pins: 1, 2
1 alternate drawing of the same symbol

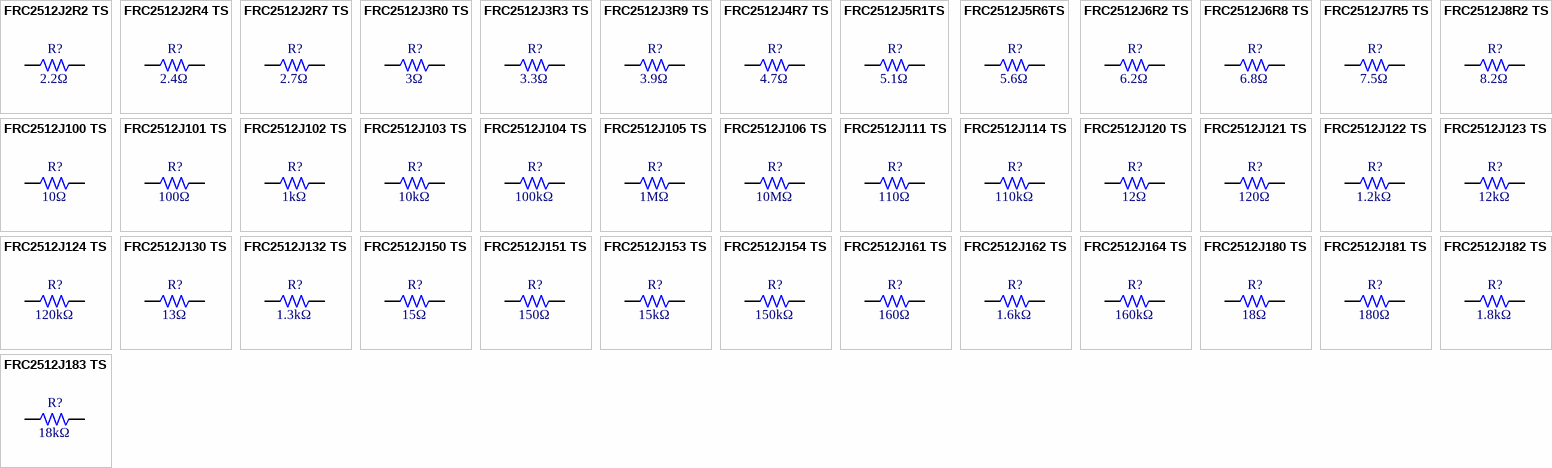
[diagram p33: symbols FRC2512J2R2 TS to FRC2512J183 TS]

## FRC2512J2R2 TS
designator R?  Resistance: 2.2Ω  (hidden comment: *)
Resistor, 2.2Ω, ±5%, 1W, 200V, ±200ppm/℃, -55℃~+155℃, SMD 2512; Manufacturer: Uniroyal; Manufacturer Part Number: FRC2512J2R2 TS; Supplier 1: LCSC; Supplier Part Number 1: C2907574; JLCPCB Part Number: C2907574; Power Rating: 1W; Category: Resistors; Package Size: 2512; JLCPCB Basic Part: Yes; Tolerance: ±5%; Voltage Rating: 200V; Temperature Coefficient: ±200ppm/℃; Temperature Rating: -55℃~+155℃; ComponentLink1Description: Datasheet; ComponentLink1URL: https://wmsc.lcsc.com/wmsc/upload/file/pdf/v2/lcsc/2308241009_FOJAN-FRC2512J2R2-TS_C2907574.pdf; ComponentLink2Description: JLCPCB Part URL; ComponentLink2URL: https://jlcpcb.com/partdetail/C2907574
pins: 1, 2
1 alternate drawing of the same symbol

## FRC2512J2R4 TS
designator R?  Resistance: 2.4Ω  (hidden comment: *)
Resistor, 2.4Ω, ±5%, 1W, 200V, ±200ppm/℃, -55℃~+155℃, SMD 2512; Manufacturer: Uniroyal; Manufacturer Part Number: FRC2512J2R4 TS; Supplier 1: LCSC; Supplier Part Number 1: C2934106; JLCPCB Part Number: C2934106; Power Rating: 1W; Category: Resistors; Package Size: 2512; JLCPCB Basic Part: Yes; Tolerance: ±5%; Voltage Rating: 200V; Temperature Coefficient: ±200ppm/℃; Temperature Rating: -55℃~+155℃; ComponentLink1Description: Datasheet; ComponentLink1URL: https://wmsc.lcsc.com/wmsc/upload/file/pdf/v2/lcsc/2308241947_FOJAN-FRC2512J2R4-TS_C2934106.pdf; ComponentLink2Description: JLCPCB Part URL; ComponentLink2URL: https://jlcpcb.com/partdetail/C2934106
pins: 1, 2
1 alternate drawing of the same symbol

## FRC2512J2R7 TS
designator R?  Resistance: 2.7Ω  (hidden comment: *)
Resistor, 2.7Ω, ±5%, 1W, 200V, ±200ppm/℃, -55℃~+155℃, SMD 2512; Manufacturer: Uniroyal; Manufacturer Part Number: FRC2512J2R7 TS; Supplier 1: LCSC; Supplier Part Number 1: C2960733; JLCPCB Part Number: C2960733; Power Rating: 1W; Category: Resistors; Package Size: 2512; JLCPCB Basic Part: Yes; Tolerance: ±5%; Voltage Rating: 200V; Temperature Coefficient: ±200ppm/℃; Temperature Rating: -55℃~+155℃; ComponentLink1Description: Datasheet; ComponentLink1URL: https://wmsc.lcsc.com/wmsc/upload/file/pdf/v2/lcsc/2308241947_FOJAN-FRC2512J2R7-TS_C2960733.pdf; ComponentLink2Description: JLCPCB Part URL; ComponentLink2URL: https://jlcpcb.com/partdetail/C2960733
pins: 1, 2
1 alternate drawing of the same symbol

## FRC2512J3R0 TS
designator R?  Resistance: 3Ω  (hidden comment: *)
Resistor, 3Ω, ±5%, 1W, 200V, ±200ppm/℃, -55℃~+155℃, SMD 2512; Manufacturer: Uniroyal; Manufacturer Part Number: FRC2512J3R0 TS; Supplier 1: LCSC; Supplier Part Number 1: C2960837; JLCPCB Part Number: C2960837; Power Rating: 1W; Category: Resistors; Package Size: 2512; JLCPCB Basic Part: Yes; Tolerance: ±5%; Voltage Rating: 200V; Temperature Coefficient: ±200ppm/℃; Temperature Rating: -55℃~+155℃; ComponentLink1Description: Datasheet; ComponentLink1URL: https://wmsc.lcsc.com/wmsc/upload/file/pdf/v2/lcsc/2308241947_FOJAN-FRC2512J3R0-TS_C2960837.pdf; ComponentLink2Description: JLCPCB Part URL; ComponentLink2URL: https://jlcpcb.com/partdetail/C2960837
pins: 1, 2
1 alternate drawing of the same symbol

## FRC2512J3R3 TS
designator R?  Resistance: 3.3Ω  (hidden comment: *)
Resistor, 3.3Ω, ±5%, 1W, 200V, ±200ppm/℃, -55℃~+155℃, SMD 2512; Manufacturer: Uniroyal; Manufacturer Part Number: FRC2512J3R3 TS; Supplier 1: LCSC; Supplier Part Number 1: C2960677; JLCPCB Part Number: C2960677; Power Rating: 1W; Category: Resistors; Package Size: 2512; JLCPCB Basic Part: Yes; Tolerance: ±5%; Voltage Rating: 200V; Temperature Coefficient: ±200ppm/℃; Temperature Rating: -55℃~+155℃; ComponentLink1Description: Datasheet; ComponentLink1URL: https://wmsc.lcsc.com/wmsc/upload/file/pdf/v2/lcsc/2308241947_FOJAN-FRC2512J3R3-TS_C2960677.pdf; ComponentLink2Description: JLCPCB Part URL; ComponentLink2URL: https://jlcpcb.com/partdetail/C2960677
pins: 1, 2
1 alternate drawing of the same symbol

## FRC2512J3R9 TS
designator R?  Resistance: 3.9Ω  (hidden comment: *)
Resistor, 3.9Ω, ±5%, 1W, 200V, ±200ppm/℃, -55℃~+155℃, SMD 2512; Manufacturer: Uniroyal; Manufacturer Part Number: FRC2512J3R9 TS; Supplier 1: LCSC; Supplier Part Number 1: C2934114; JLCPCB Part Number: C2934114; Power Rating: 1W; Category: Resistors; Package Size: 2512; JLCPCB Basic Part: Yes; Tolerance: ±5%; Voltage Rating: 200V; Temperature Coefficient: ±200ppm/℃; Temperature Rating: -55℃~+155℃; ComponentLink1Description: Datasheet; ComponentLink1URL: https://wmsc.lcsc.com/wmsc/upload/file/pdf/v2/lcsc/2308241947_FOJAN-FRC2512J3R9-TS_C2934114.pdf; ComponentLink2Description: JLCPCB Part URL; ComponentLink2URL: https://jlcpcb.com/partdetail/C2934114
pins: 1, 2
1 alternate drawing of the same symbol

## FRC2512J4R7 TS
designator R?  Resistance: 4.7Ω  (hidden comment: *)
Resistor, 4.7Ω, ±5%, 1W, 200V, ±200ppm/℃, -55℃~+155℃, SMD 2512; Manufacturer: Uniroyal; Manufacturer Part Number: FRC2512J4R7 TS; Supplier 1: LCSC; Supplier Part Number 1: C2907584; JLCPCB Part Number: C2907584; Power Rating: 1W; Category: Resistors; Package Size: 2512; JLCPCB Basic Part: Yes; Tolerance: ±5%; Voltage Rating: 200V; Temperature Coefficient: ±200ppm/℃; Temperature Rating: -55℃~+155℃; ComponentLink1Description: Datasheet; ComponentLink1URL: https://wmsc.lcsc.com/wmsc/upload/file/pdf/v2/lcsc/2308241009_FOJAN-FRC2512J4R7-TS_C2907584.pdf; ComponentLink2Description: JLCPCB Part URL; ComponentLink2URL: https://jlcpcb.com/partdetail/C2907584
pins: 1, 2
1 alternate drawing of the same symbol

## FRC2512J5R1TS
designator R?  Resistance: 5.1Ω  (hidden comment: *)
Resistor, 5.1Ω, ±5%, 1W, 200V, ±200ppm/℃, SMD 2512; Manufacturer: Uniroyal; Manufacturer Part Number: FRC2512J5R1TS; Supplier 1: LCSC; Supplier Part Number 1: C3000793; JLCPCB Part Number: C3000793; Power Rating: 1W; Category: Resistors; Package Size: 2512; JLCPCB Basic Part: Yes; Tolerance: ±5%; Voltage Rating: 200V; Temperature Coefficient: ±200ppm/℃; ComponentLink1Description: Datasheet; ComponentLink1URL: https://wmsc.lcsc.com/wmsc/upload/file/pdf/v2/lcsc/2308241947_FOJAN-FRC2512J5R1TS_C3000793.pdf; ComponentLink2Description: JLCPCB Part URL; ComponentLink2URL: https://jlcpcb.com/partdetail/C3000793
pins: 1, 2
1 alternate drawing of the same symbol

## FRC2512J5R6TS
designator R?  Resistance: 5.6Ω  (hidden comment: *)
Resistor, 5.6Ω, ±5%, 1W, 200V, ±200ppm/℃, SMD 2512; Manufacturer: Uniroyal; Manufacturer Part Number: FRC2512J5R6TS; Supplier 1: LCSC; Supplier Part Number 1: C3000663; JLCPCB Part Number: C3000663; Power Rating: 1W; Category: Resistors; Package Size: 2512; JLCPCB Basic Part: Yes; Tolerance: ±5%; Voltage Rating: 200V; Temperature Coefficient: ±200ppm/℃; ComponentLink1Description: Datasheet; ComponentLink1URL: https://wmsc.lcsc.com/wmsc/upload/file/pdf/v2/lcsc/2308241947_FOJAN-FRC2512J5R6TS_C3000663.pdf; ComponentLink2Description: JLCPCB Part URL; ComponentLink2URL: https://jlcpcb.com/partdetail/C3000663
pins: 1, 2
1 alternate drawing of the same symbol

## FRC2512J6R2 TS
designator R?  Resistance: 6.2Ω  (hidden comment: *)
Resistor, 6.2Ω, ±5%, 1W, 200V, ±200ppm/℃, -55℃~+155℃, SMD 2512; Manufacturer: Uniroyal; Manufacturer Part Number: FRC2512J6R2 TS; Supplier 1: LCSC; Supplier Part Number 1: C2934127; JLCPCB Part Number: C2934127; Power Rating: 1W; Category: Resistors; Package Size: 2512; JLCPCB Basic Part: Yes; Tolerance: ±5%; Voltage Rating: 200V; Temperature Coefficient: ±200ppm/℃; Temperature Rating: -55℃~+155℃; ComponentLink1Description: Datasheet; ComponentLink1URL: https://wmsc.lcsc.com/wmsc/upload/file/pdf/v2/lcsc/2308241947_FOJAN-FRC2512J6R2-TS_C2934127.pdf; ComponentLink2Description: JLCPCB Part URL; ComponentLink2URL: https://jlcpcb.com/partdetail/C2934127
pins: 1, 2
1 alternate drawing of the same symbol
